# Altium footprint library WR-TBL_Pluggable PCB Header_3.81mm.PcbLib: 198 footprints (part 7 of 13)
Each footprint in its own frame and in the unit in brackets; x right, y up, seen from the top. Pads: shape width x height; smd on the part's side, far side on the other; paste and mask are expansions set on the pad; w line width, h text height; cw(c..) or ccw(c..) is an arc to the next point about the centre after c.
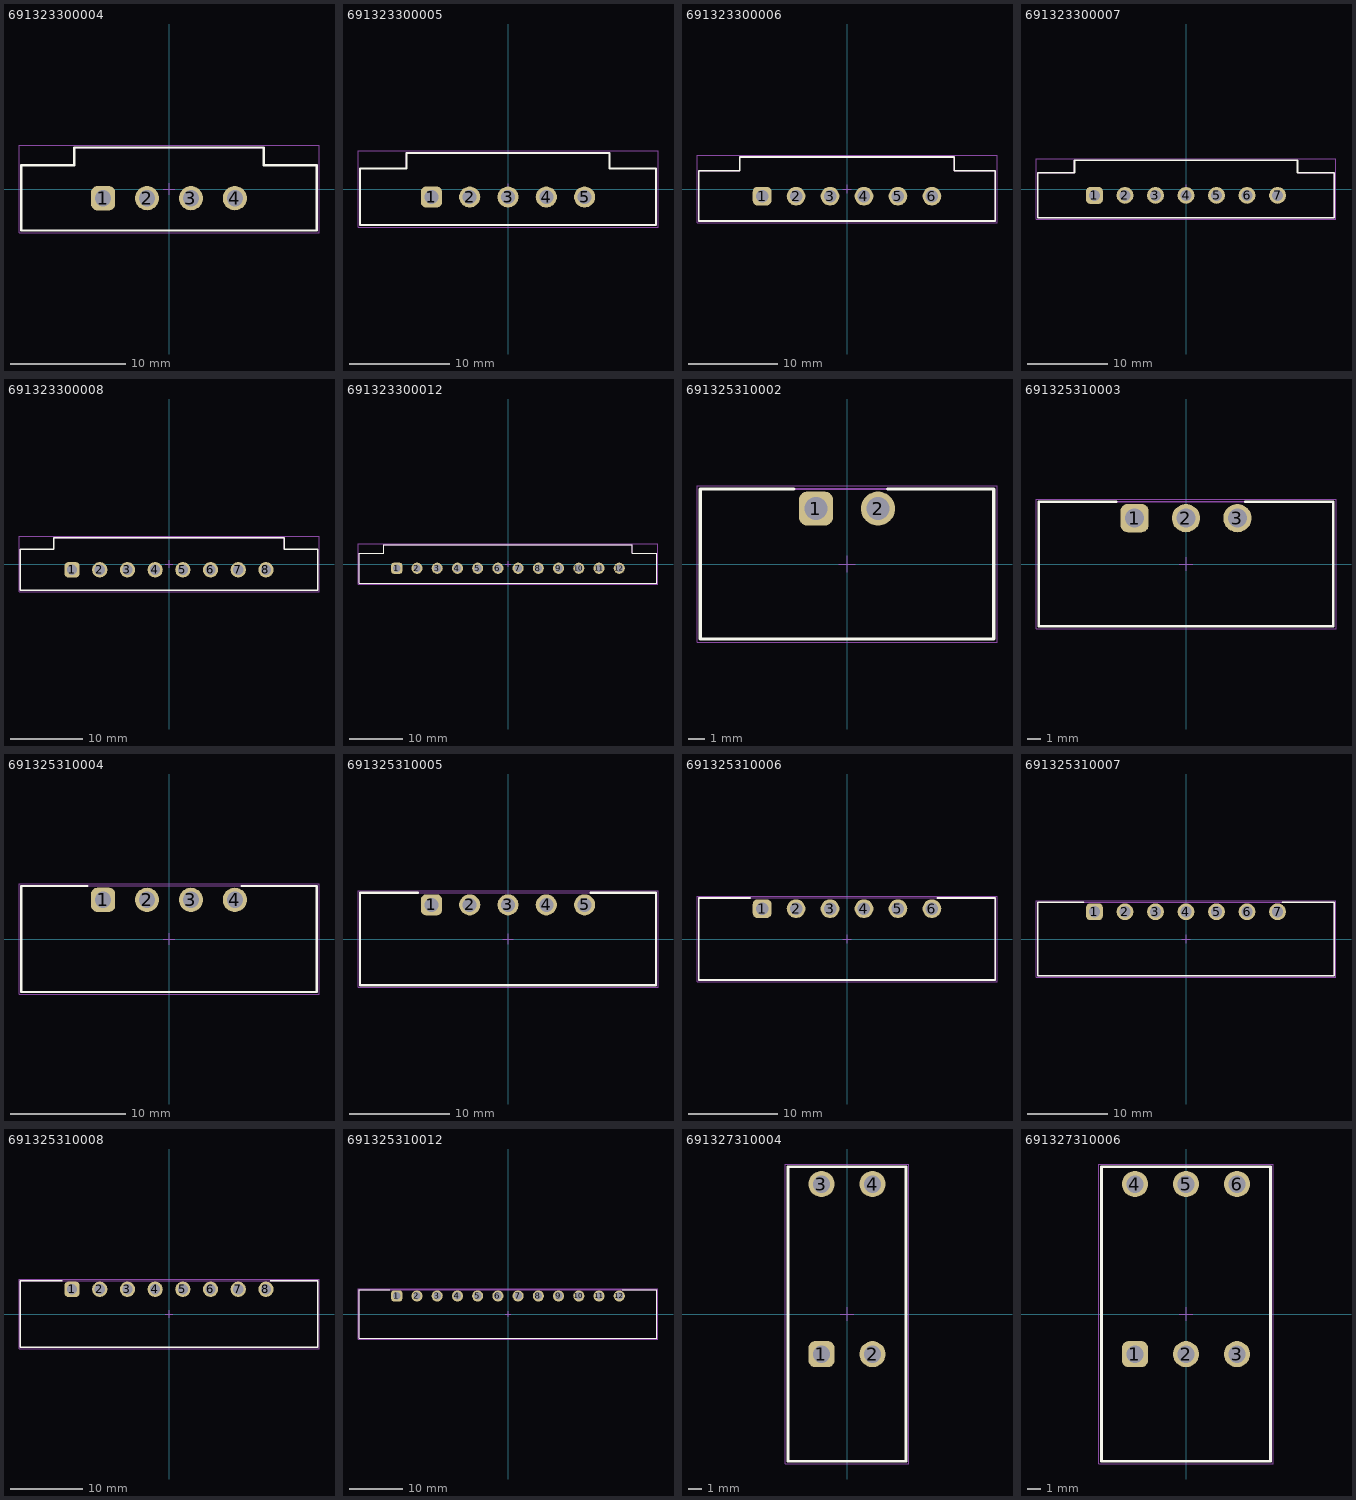
[diagram p6: the footprints below, top view; thin cyan lines are the x and y axes]

## 691323300004 [mm] "Vertical PCB Header with Flanges, pitch 3.81mm, 04p"
height 9.2
pads (4):
  rrect50% 2.1x2.1 hole 1.4: 1(-5.715,-0.8)
  round 2.1 hole 1.4: 2(-1.905,-0.8) 3(1.905,-0.8) 4(5.715,-0.8)
Top Overlay:
  lines w0.2: -12.815,-3.6 12.815,-3.6 12.815,2.05 8.21,2.05 8.21,3.6 -8.21,3.6 -8.21,2.05 -12.815,2.05 -12.815,-3.6
Top Designator:
  text ".Designator" at -7.498,-0.5 h1.5
Top Component Outline:
  lines w0.1: -12.815,-3.6 -12.815,2.05 -8.21,2.05 -8.21,3.6 8.21,3.6 8.21,2.05 12.815,2.05 12.815,-3.6 -12.815,-3.6
Top 3D Body:
  lines w0.1: -12.815,-3.6 12.815,-3.6 12.815,2.05 8.21,2.05 8.21,3.6 -8.21,3.6 -8.21,2.05 -12.815,2.05 -12.815,-3.6
Top Courtyard:
  lines w0.05: -13.015,-3.8 13.015,-3.8 13.015,3.8 -13.015,3.8 -13.015,-3.8
Top Component Center:
  lines w0.05: -0.5,0 0.5,0 ; 0,-0.5 0,0.5
3D body "691323300004.stp": height 9.25, standoff -3.45, extent -12.815,-3.6 12.815,3.6

## 691323300005 [mm] "Vertical PCB Header with Flanges, pitch 3.81mm, 05p"
height 9.2
pads (5):
  rrect50% 2.1x2.1 hole 1.4: 1(-7.62,-0.8)
  round 2.1 hole 1.4: 2(-3.81,-0.8) 3(0,-0.8) 4(3.81,-0.8) 5(7.62,-0.8)
Top Overlay:
  lines w0.2: -14.72,-3.6 14.72,-3.6 14.72,2.05 10.115,2.05 10.115,3.6 -10.115,3.6 -10.115,2.05 -14.72,2.05 -14.72,-3.6
Top Designator:
  text ".Designator" at -7.498,-0.5 h1.5
Top Component Outline:
  lines w0.1: -14.72,-3.6 -14.72,2.05 -10.115,2.05 -10.115,3.6 10.115,3.6 10.115,2.05 14.72,2.05 14.72,-3.6 -14.72,-3.6
Top 3D Body:
  lines w0.1: -14.72,-3.6 14.72,-3.6 14.72,2.05 10.115,2.05 10.115,3.6 -10.115,3.6 -10.115,2.05 -14.72,2.05 -14.72,-3.6
Top Courtyard:
  lines w0.05: -14.92,-3.8 14.92,-3.8 14.92,3.8 -14.92,3.8 -14.92,-3.8
Top Component Center:
  lines w0.05: -0.5,0 0.5,0 ; 0,-0.5 0,0.5
3D body "691323300005.stp": height 9.25, standoff -3.45, extent -14.72,-3.6 14.72,3.6

## 691323300006 [mm] "Vertical PCB Header with Flanges, pitch 3.81mm, 06p"
height 9.2
pads (6):
  rrect50% 2.1x2.1 hole 1.4: 1(-9.525,-0.8)
  round 2.1 hole 1.4: 2(-5.715,-0.8) 3(-1.905,-0.8) 4(1.905,-0.8) 5(5.715,-0.8) 6(9.525,-0.8)
Top Overlay:
  lines w0.2: -16.625,-3.6 16.625,-3.6 16.625,2.05 12.02,2.05 12.02,3.6 -12.02,3.6 -12.02,2.05 -16.625,2.05 -16.625,-3.6
Top Designator:
  text ".Designator" at -7.498,-0.5 h1.5
Top Component Outline:
  lines w0.1: -16.625,-3.6 -16.625,2.05 -12.02,2.05 -12.02,3.6 12.02,3.6 12.02,2.05 16.625,2.05 16.625,-3.6 -16.625,-3.6
Top 3D Body:
  lines w0.1: -16.625,-3.6 16.625,-3.6 16.625,2.05 12.02,2.05 12.02,3.6 -12.02,3.6 -12.02,2.05 -16.625,2.05 -16.625,-3.6
Top Courtyard:
  lines w0.05: -16.825,-3.8 16.825,-3.8 16.825,3.8 -16.825,3.8 -16.825,-3.8
Top Component Center:
  lines w0.05: -0.5,0 0.5,0 ; 0,-0.5 0,0.5
3D body "691323300006.stp": height 9.25, standoff -3.45, extent -16.625,-3.6 16.625,3.6

## 691323300007 [mm] "Vertical PCB Header with Flanges, pitch 3.81mm, 07p"
height 9.2
pads (7):
  rrect50% 2.1x2.1 hole 1.4: 1(-11.43,-0.8)
  round 2.1 hole 1.4: 2(-7.62,-0.8) 3(-3.81,-0.8) 4(0,-0.8) 5(3.81,-0.8) 6(7.62,-0.8) 7(11.43,-0.8)
Top Overlay:
  lines w0.2: -18.53,-3.6 18.53,-3.6 18.53,2.05 13.925,2.05 13.925,3.6 -13.925,3.6 -13.925,2.05 -18.53,2.05 -18.53,-3.6
Top Designator:
  text ".Designator" at -7.498,-0.5 h1.5
Top Component Outline:
  lines w0.1: -18.53,-3.6 -18.53,2.05 -13.925,2.05 -13.925,3.6 13.925,3.6 13.925,2.05 18.53,2.05 18.53,-3.6 -18.53,-3.6
Top 3D Body:
  lines w0.1: -18.53,-3.6 18.53,-3.6 18.53,2.05 13.925,2.05 13.925,3.6 -13.925,3.6 -13.925,2.05 -18.53,2.05 -18.53,-3.6
Top Courtyard:
  lines w0.05: -18.73,-3.8 18.73,-3.8 18.73,3.8 -18.73,3.8 -18.73,-3.8
Top Component Center:
  lines w0.05: -0.5,0 0.5,0 ; 0,-0.5 0,0.5
3D body "691323300007.stp": height 9.25, standoff -3.45, extent -18.53,-3.6 18.53,3.6

## 691323300008 [mm] "Vertical PCB Header with Flanges, pitch 3.81mm, 08p"
height 9.2
pads (8):
  rrect50% 2.1x2.1 hole 1.4: 1(-13.335,-0.8)
  round 2.1 hole 1.4: 2(-9.525,-0.8) 3(-5.715,-0.8) 4(-1.905,-0.8) 5(1.905,-0.8) 6(5.715,-0.8) 7(9.525,-0.8) 8(13.335,-0.8)
Top Overlay:
  lines w0.2: -20.435,-3.6 -20.435,2.05 -15.83,2.05 -15.83,3.6 15.83,3.6 15.83,2.05 20.435,2.05 20.435,-3.6 -20.435,-3.6
Top Designator:
  text ".Designator" at -7.498,-0.5 h1.5
Top Component Outline:
  lines w0.1: -20.435,-3.6 20.435,-3.6 20.435,2.05 15.83,2.05 15.83,3.6 -15.83,3.6 -15.83,2.05 -20.435,2.05 -20.435,-3.6
Top 3D Body:
  lines w0.1: -20.435,-3.6 -20.435,2.05 -15.83,2.05 -15.83,3.6 15.83,3.6 15.83,2.05 20.435,2.05 20.435,-3.6 -20.435,-3.6
Top Courtyard:
  lines w0.05: -20.635,-3.8 -20.635,3.8 20.635,3.8 20.635,-3.8 -20.635,-3.8
Top Component Center:
  lines w0.05: -0.5,0 0.5,0 ; 0,-0.5 0,0.5
3D body "691323300008.stp": height 9.25, standoff -3.45, extent -20.435,-3.6 20.435,3.6

## 691323300012 [mm] "Vertical PCB Header with Flanges, pitch 3.81mm, 12p"
height 9.2
pads (12):
  rrect50% 2.1x2.1 hole 1.4: 1(-20.955,-0.8)
  round 2.1 hole 1.4: 2(-17.145,-0.8) 3(-13.335,-0.8) 4(-9.525,-0.8) 5(-5.715,-0.8) 6(-1.905,-0.8) 7(1.905,-0.8) 8(5.715,-0.8) 9(9.525,-0.8) 10(13.335,-0.8) 11(17.145,-0.8) 12(20.955,-0.8)
Top Overlay:
  lines w0.2: -28.055,-3.6 -28.055,2.05 -23.45,2.05 -23.45,3.6 23.45,3.6 23.45,2.05 28.055,2.05 28.055,-3.6 -28.055,-3.6
Top Designator:
  text ".Designator" at -7.498,-0.5 h1.5
Top Component Outline:
  lines w0.1: -28.055,-3.6 28.055,-3.6 28.055,2.05 23.45,2.05 23.45,3.6 -23.45,3.6 -23.45,2.05 -28.055,2.05 -28.055,-3.6
Top 3D Body:
  lines w0.1: -28.055,-3.6 -28.055,2.05 -23.45,2.05 -23.45,3.6 23.45,3.6 23.45,2.05 28.055,2.05 28.055,-3.6 -28.055,-3.6
Top Courtyard:
  lines w0.05: -28.255,-3.8 -28.255,3.8 28.255,3.8 28.255,-3.8 -28.255,-3.8
Top Component Center:
  lines w0.05: -0.5,0 0.5,0 ; 0,-0.5 0,0.5
3D body "691323300012.stp": height 9.25, standoff -3.45, extent -28.055,-3.6 28.055,3.6

## 691325310002 [mm] "Horizontal PCB Header with Flanges, pitch 3.81mm, 02p"
height 7
pads (2):
  rrect50% 2.1x2.1 hole 1.4: 1(-1.905,3.4)
  round 2.1 hole 1.4: 2(1.905,3.4)
Top Overlay:
  lines w0.2: -3.255,4.6 -9.005,4.6 -9.005,-4.6 9.005,-4.6 9.005,4.6 2.495,4.6
Top Designator:
  text ".Designator" at -7.498,-0.5 h1.5
Top Component Outline:
  lines w0.1: -9.005,-4.6 -9.005,4.6 9.005,4.6 9.005,-4.6 -9.005,-4.6
Top 3D Body:
  lines w0.1: -9.005,-4.6 9.005,-4.6 9.005,4.6 -9.005,4.6 -9.005,-4.6
Top Courtyard:
  lines w0.05: -9.205,-4.8 9.205,-4.8 9.205,4.8 -9.205,4.8 -9.205,-4.8
Top Component Center:
  lines w0.05: -0.5,0 0.5,0 ; 0,-0.5 0,0.5
3D body "691325310002.stp": height 7.3, standoff -3.4, extent -9.005,-4.6 9.005,4.6

## 691325310003 [mm] "Horizontal PCB Header with Flanges, pitch 3.81mm, 03p"
height 7
pads (3):
  rrect50% 2.1x2.1 hole 1.4: 1(-3.81,3.4)
  round 2.1 hole 1.4: 2(0,3.4) 3(3.81,3.4)
Top Overlay:
  lines w0.2: -5.16,4.6 -10.91,4.6 -10.91,-4.6 10.91,-4.6 10.91,4.6 4.4,4.6
Top Designator:
  text ".Designator" at -7.498,-0.5 h1.5
Top Component Outline:
  lines w0.1: -10.91,-4.6 -10.91,4.6 10.91,4.6 10.91,-4.6 -10.91,-4.6
Top 3D Body:
  lines w0.1: -10.91,-4.6 10.91,-4.6 10.91,4.6 -10.91,4.6 -10.91,-4.6
Top Courtyard:
  lines w0.05: -11.11,-4.8 11.11,-4.8 11.11,4.8 -11.11,4.8 -11.11,-4.8
Top Component Center:
  lines w0.05: -0.5,0 0.5,0 ; 0,-0.5 0,0.5
3D body "691325310003.stp": height 7.3, standoff -3.4, extent -10.91,-4.6 10.91,4.6

## 691325310004 [mm] "Horizontal PCB Header with Flanges, pitch 3.81mm, 04p"
height 7
pads (4):
  rrect50% 2.1x2.1 hole 1.4: 1(-5.715,3.4)
  round 2.1 hole 1.4: 2(-1.905,3.4) 3(1.905,3.4) 4(5.715,3.4)
Top Overlay:
  lines w0.2: -7.065,4.6 -12.815,4.6 -12.815,-4.6 12.815,-4.6 12.815,4.6 6.305,4.6
Top Designator:
  text ".Designator" at -7.498,-0.5 h1.5
Top Component Outline:
  lines w0.1: -12.815,-4.6 -12.815,4.6 12.815,4.6 12.815,-4.6 -12.815,-4.6
Top 3D Body:
  lines w0.1: -12.815,-4.6 12.815,-4.6 12.815,4.6 -12.815,4.6 -12.815,-4.6
Top Courtyard:
  lines w0.05: -13.015,-4.8 13.015,-4.8 13.015,4.8 -13.015,4.8 -13.015,-4.8
Top Component Center:
  lines w0.05: -0.5,0 0.5,0 ; 0,-0.5 0,0.5
3D body "691325310004.stp": height 7.3, standoff -3.4, extent -12.815,-4.6 12.815,4.6

## 691325310005 [mm] "Horizontal PCB Header with Flanges, pitch 3.81mm, 05p"
height 7
pads (5):
  rrect50% 2.1x2.1 hole 1.4: 1(-7.62,3.4)
  round 2.1 hole 1.4: 2(-3.81,3.4) 3(0,3.4) 4(3.81,3.4) 5(7.62,3.4)
Top Overlay:
  lines w0.2: -8.97,4.6 -14.72,4.6 -14.72,-4.6 14.72,-4.6 14.72,4.6 8.21,4.6
Top Designator:
  text ".Designator" at -7.498,-0.5 h1.5
Top Component Outline:
  lines w0.1: -14.72,-4.6 -14.72,4.6 14.72,4.6 14.72,-4.6 -14.72,-4.6
Top 3D Body:
  lines w0.1: -14.72,-4.6 14.72,-4.6 14.72,4.6 -14.72,4.6 -14.72,-4.6
Top Courtyard:
  lines w0.05: -14.92,-4.8 14.92,-4.8 14.92,4.8 -14.92,4.8 -14.92,-4.8
Top Component Center:
  lines w0.05: -0.5,0 0.5,0 ; 0,-0.5 0,0.5
3D body "691325310005.stp": height 7.3, standoff -3.4, extent -14.72,-4.6 14.72,4.6

## 691325310006 [mm] "Horizontal PCB Header with Flanges, pitch 3.81mm, 06p"
height 7
pads (6):
  rrect50% 2.1x2.1 hole 1.4: 1(-9.525,3.4)
  round 2.1 hole 1.4: 2(-5.715,3.4) 3(-1.905,3.4) 4(1.905,3.4) 5(5.715,3.4) 6(9.525,3.4)
Top Overlay:
  lines w0.2: -10.875,4.6 -16.625,4.6 -16.625,-4.6 16.625,-4.6 16.625,4.6 10.115,4.6
Top Designator:
  text ".Designator" at -7.498,-0.5 h1.5
Top Component Outline:
  lines w0.1: -16.625,-4.6 -16.625,4.6 16.625,4.6 16.625,-4.6 -16.625,-4.6
Top 3D Body:
  lines w0.1: -16.625,-4.6 16.625,-4.6 16.625,4.6 -16.625,4.6 -16.625,-4.6
Top Courtyard:
  lines w0.05: -16.825,-4.8 16.825,-4.8 16.825,4.8 -16.825,4.8 -16.825,-4.8
Top Component Center:
  lines w0.05: -0.5,0 0.5,0 ; 0,-0.5 0,0.5
3D body "691325310006.stp": height 7.3, standoff -3.4, extent -16.625,-4.6 16.625,4.6

## 691325310007 [mm] "Horizontal PCB Header with Flanges, pitch 3.81mm, 07p"
height 7
pads (7):
  rrect50% 2.1x2.1 hole 1.4: 1(-11.43,3.4)
  round 2.1 hole 1.4: 2(-7.62,3.4) 3(-3.81,3.4) 4(0,3.4) 5(3.81,3.4) 6(7.62,3.4) 7(11.43,3.4)
Top Overlay:
  lines w0.2: -12.78,4.6 -18.53,4.6 -18.53,-4.6 18.53,-4.6 18.53,4.6 12.02,4.6
Top Designator:
  text ".Designator" at -7.498,-0.5 h1.5
Top Component Outline:
  lines w0.1: -18.53,-4.6 -18.53,4.6 18.53,4.6 18.53,-4.6 -18.53,-4.6
Top 3D Body:
  lines w0.1: -18.53,-4.6 18.53,-4.6 18.53,4.6 -18.53,4.6 -18.53,-4.6
Top Courtyard:
  lines w0.05: -18.73,-4.8 18.73,-4.8 18.73,4.8 -18.73,4.8 -18.73,-4.8
Top Component Center:
  lines w0.05: -0.5,0 0.5,0 ; 0,-0.5 0,0.5
3D body "691325310007.stp": height 7.3, standoff -3.4, extent -18.53,-4.6 18.53,4.6

## 691325310008 [mm] "Horizontal PCB Header with Flanges, pitch 3.81mm, 08p"
height 7
pads (8):
  rrect50% 2.1x2.1 hole 1.4: 1(-13.335,3.4)
  round 2.1 hole 1.4: 2(-9.525,3.4) 3(-5.715,3.4) 4(-1.905,3.4) 5(1.905,3.4) 6(5.715,3.4) 7(9.525,3.4) 8(13.335,3.4)
Top Overlay:
  lines w0.2: -14.685,4.6 -20.435,4.6 -20.435,-4.6 20.435,-4.6 20.435,4.6 13.925,4.6
Top Designator:
  text ".Designator" at -7.498,-0.5 h1.5
Top Component Outline:
  lines w0.1: -20.435,-4.6 -20.435,4.6 20.435,4.6 20.435,-4.6 -20.435,-4.6
Top 3D Body:
  lines w0.1: -20.435,-4.6 20.435,-4.6 20.435,4.6 -20.435,4.6 -20.435,-4.6
Top Courtyard:
  lines w0.05: -20.635,-4.8 20.635,-4.8 20.635,4.8 -20.635,4.8 -20.635,-4.8
Top Component Center:
  lines w0.05: -0.5,0 0.5,0 ; 0,-0.5 0,0.5
3D body "691325310008.stp": height 7.3, standoff -3.4, extent -20.435,-4.6 20.435,4.6

## 691325310012 [mm] "Horizontal PCB Header with Flanges, pitch 3.81mm, 12p"
height 7
pads (12):
  rrect50% 2.1x2.1 hole 1.4: 1(-20.955,3.4)
  round 2.1 hole 1.4: 2(-17.145,3.4) 3(-13.335,3.4) 4(-9.525,3.4) 5(-5.715,3.4) 6(-1.905,3.4) 7(1.905,3.4) 8(5.715,3.4) 9(9.525,3.4) 10(13.335,3.4) 11(17.145,3.4) 12(20.955,3.4)
Top Overlay:
  lines w0.2: -22.305,4.6 -28.055,4.6 -28.055,-4.6 28.055,-4.6 28.055,4.6 21.545,4.6
Top Designator:
  text ".Designator" at -7.498,-0.5 h1.5
Top Component Outline:
  lines w0.1: -28.055,-4.6 28.055,-4.6 28.055,4.6 -28.055,4.6 -28.055,-4.6
Top 3D Body:
  lines w0.1: -28.055,-4.6 -28.055,4.6 28.055,4.6 28.055,-4.6 -28.055,-4.6
Top Courtyard:
  lines w0.05: -28.255,-4.8 -28.255,4.8 28.255,4.8 28.255,-4.8 -28.255,-4.8
Top Component Center:
  lines w0.05: -0.5,0 0.5,0 ; 0,-0.5 0,0.5
3D body "691325310012.stp": height 7.3, standoff -3.4, extent -28.055,-4.6 28.055,4.6

## 691327310004 [mm] "Dual Horizontal PCB Header, pitch 3.81mm, 04p"
height 22.7
pads (4):
  rrect50% 1.95x1.95 hole 1.3: 1(-1.905,-3)
  round 1.95 hole 1.3: 2(1.905,-3) 3(-1.905,9.7) 4(1.905,9.7)
Top Overlay:
  lines w0.2: -4.405,-11 4.405,-11 4.405,11 -4.405,11 -4.405,-11
Top Designator:
  text ".Designator" at -7.498,-0.5 h1.5
Top Component Outline:
  lines w0.1: -4.405,-11 -4.405,11 4.405,11 4.405,-11 -4.405,-11
Top 3D Body:
  lines w0.1: -4.405,-11 4.405,-11 4.405,11 -4.405,11 -4.405,-11
Top Courtyard:
  lines w0.05: -4.605,-11.2 -4.605,11.2 4.605,11.2 4.605,-11.2 -4.605,-11.2
Top Component Center:
  lines w0.05: -0.5,0 0.5,0 ; 0,-0.5 0,0.5
3D body "691327310004.stp": height 22.85, standoff -3.35, extent -4.405,-11 4.405,11

## 691327310006 [mm] "Dual Horizontal PCB Header, pitch 3.81mm, 06p"
height 22.7
pads (6):
  rrect50% 1.95x1.95 hole 1.3: 1(-3.81,-3)
  round 1.95 hole 1.3: 2(0,-3) 3(3.81,-3) 4(-3.81,9.7) 5(0,9.7) 6(3.81,9.7)
Top Overlay:
  lines w0.2: -6.31,-11 -6.31,11 6.31,11 6.31,-11 -6.31,-11
Top Designator:
  text ".Designator" at -7.498,-0.5 h1.5
Top Component Outline:
  lines w0.1: -6.31,-11 6.31,-11 6.31,11 -6.31,11 -6.31,-11
Top 3D Body:
  lines w0.1: -6.31,-11 -6.31,11 6.31,11 6.31,-11 -6.31,-11
Top Courtyard:
  lines w0.05: -6.51,-11.2 6.51,-11.2 6.51,11.2 -6.51,11.2 -6.51,-11.2
Top Component Center:
  lines w0.05: -0.5,0 0.5,0 ; 0,-0.5 0,0.5
3D body "691327310006.stp": height 22.85, standoff -3.35, extent -6.31,-11 6.31,11